# Altium footprint library Miscellaneous THD.PcbLib: 216 footprints (part 9 of 15)
Each footprint in its own frame and in the unit in brackets; x right, y up, seen from the top. Pads: shape width x height; smd on the part's side, far side on the other; paste and mask are expansions set on the pad; w line width, h text height; cw(c..) or ccw(c..) is an arc to the next point about the centre after c.
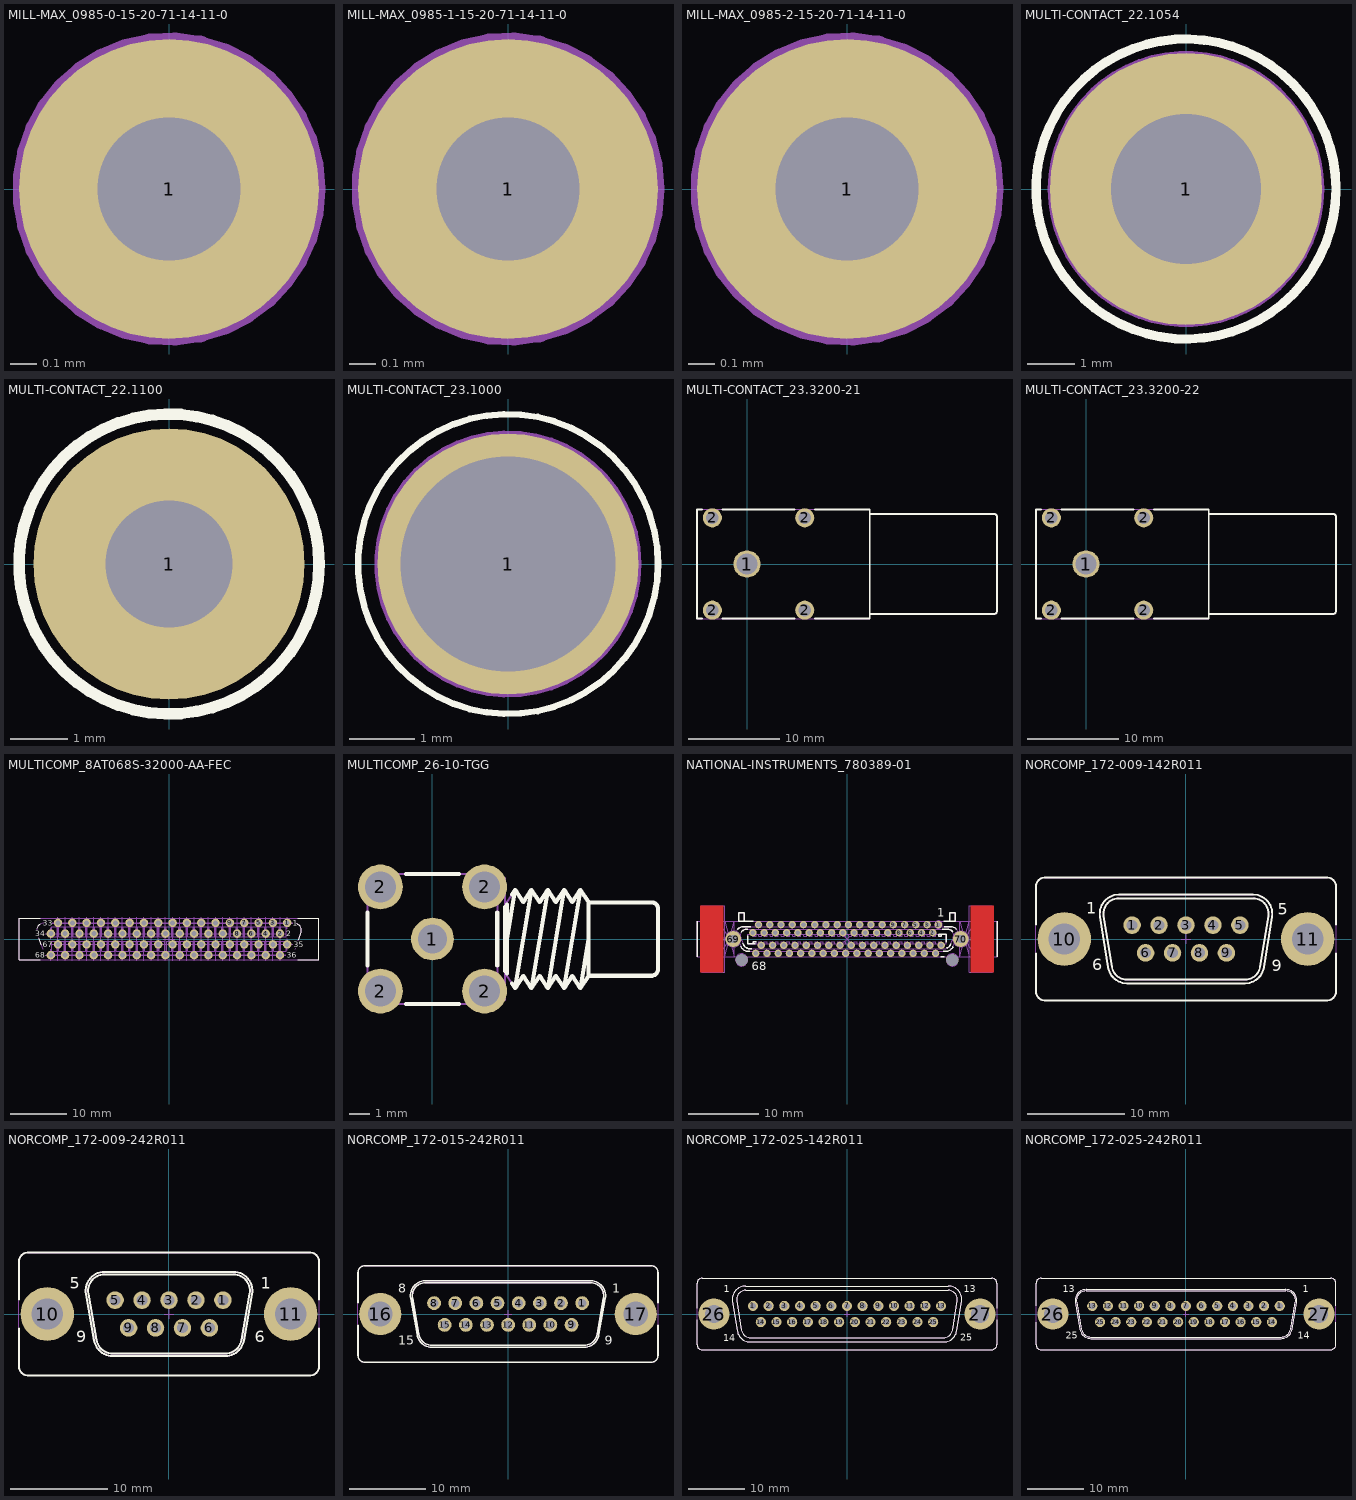
[diagram p8: the footprints below, top view; thin cyan lines are the x and y axes]

## MILL-MAX_0985-0-15-20-71-14-11-0 [mm] "Probe, Spring-Loaded Pin, 2A Continuous, 3A Peak, -55..125°C (Soldered Pin 2.61mm)"
height 6.3
pads (1):
  round 1.15 hole 0.55: 1(0,0)
Mechanical 8:
  lines w0.05: -0.5,0 0,0 ; 0,-0.5 0,0 ; 0,0.5 0,0 ; 0.5,0 0,0
Mechanical 14:
  circle w0.1: c0,0 r0.24
  circle w0.1: c0,0 r0.55
3D body "MILL-MAX_0985-0-15-20-71-14-11-0.stp": height 6.27, standoff -2.62, extent -0.542,-0.545 0.546,0.545

## MILL-MAX_0985-1-15-20-71-14-11-0 [mm] "Probe, Spring-Loaded Pin, 2A Continuous, 3A Peak, -55..125°C (Soldered Pin 3.81mm)"
height 6.3
pads (1):
  round 1.15 hole 0.55: 1(0,0)
Mechanical 8:
  lines w0.05: -0.5,0 0,0 ; 0,-0.5 0,0 ; 0,0.5 0,0 ; 0.5,0 0,0
Mechanical 14:
  circle w0.1: c0,0 r0.24
  circle w0.1: c0,0 r0.55
3D body "MILL-MAX_0985-1-15-20-71-14-11-0.stp": height 6.27, standoff -3.81, extent -0.542,-0.545 0.546,0.545

## MILL-MAX_0985-2-15-20-71-14-11-0 [mm] "Probe, Spring-Loaded Pin, 2A Continuous, 3A Peak, -55..125°C (Soldered Pin 4.83mm)"
height 6.3
pads (1):
  round 1.15 hole 0.55: 1(0,0)
Mechanical 8:
  lines w0.05: -0.5,0 0,0 ; 0,-0.5 0,0 ; 0,0.5 0,0 ; 0.5,0 0,0
Mechanical 14:
  circle w0.1: c0,0 r0.24
  circle w0.1: c0,0 r0.55
3D body "MILL-MAX_0985-2-15-20-71-14-11-0.stp": height 6.27, standoff -4.83, extent -0.542,-0.545 0.546,0.545

## MULTI-CONTACT_22.1054 [mm]
pads (1):
  round 5.8 hole 3.2: 1(0,0)
Top Overlay:
  circle w0.2: c0,0 r3.2
Mechanical 8:
  circle w0.1: c0,0 r1.75
  circle w0.1: c0,0 r2.9
  lines w0.1: -0.5,0 0,0 ; 0,-0.5 0,0 ; 0,0.5 0,0 ; 0.5,0 0,0
Mechanical 14:
  circle w0.1: c0,0 r2.5
  circle w0.1: c0,0 r1.8
  circle w0.1: c0,0 r2
  circle w0.1: c0,0 r1.949
3D body "MULTI-CONTACT_22.1054.stp": height 16, standoff 0, extent -2.5,-2.5 2.5,2.5

## MULTI-CONTACT_22.1100 [mm] "25A Multilam 2mm x 11mm plug, M2 x 10mm Termination"
height 13
pads (1):
  round 4.7 hole 2.2: 1(0,0)
Top Overlay:
  circle w0.2: c0,0 r2.6
Mechanical 8:
  lines w0.1: -1,0 0,0 ; 0,-1 0,0 ; 0,1 0,0 ; 1,0 0,0
Mechanical 14:
  circle w0.1: c0,0 r1.949
  circle w0.1: c0,0 r1
  lines w0.1: -1.949,-1.125 0,-2.25 1.949,-1.125 1.949,1.125 0,2.25 -1.949,1.125 -1.949,-1.125
3D body "MULTI-CONTACT_22.1100.stp": height 13, standoff -10, extent -1.948,-2.25 1.949,2.25

## MULTI-CONTACT_23.1000 [mm] "Uninsulated Ø 2 mm Rigid Socket"
height 2
pads (1):
  round 4 hole 3.3: 1(0,0)
Top Overlay:
  circle w0.1: c0,0 r2.3
Mechanical 8:
  circle w0.1: c0,0 r1.85
  lines w0.1: -0.5,0 0,0 ; 0,-0.5 0,0 ; 0,0.5 0,0 ; 0.5,0 0,0
Mechanical 14:
  circle w0.1: c0,0 r2
  circle w0.1: c0,0 r1
3D body "MULTI-CONTACT_23.1000.stp": height 2, standoff -4, extent -2,-2 2,2

## MULTI-CONTACT_23.3200-21 [mm] "MULTI-CONTACT Black Insulated Ø 4mm Angled Socket SLB4-I/90 For Banana 4mm"
height 11.5
pads (5):
  round 3 hole 2.3: 1(0,0)
  round 2.1 hole 1.4: 2(-3.81,-5.08) 2(-3.81,5.08) 2(6.35,-5.08) 2(6.35,5.08)
Top Overlay:
  lines w0.2: -4.931,-6 -5.5,-6 -5.5,6 -4.931,6 ; -2.689,-6 5.229,-6 ; -2.689,6 5.229,6 ; 7.471,-6 13.5,-6 13.5,6 7.471,6 ; 13.5,-5.5 27.2,-5.5 ccw(c27.2,-5.2) 27.5,-5.2 27.5,5.2 ccw(c27.2,5.2) 27.2,5.5 13.5,5.5
Mechanical 8:
  lines w0.1: -4.81,-5.08 -3.81,-5.08 ; -4.81,5.08 -3.81,5.08 ; -3.81,-6.08 -3.81,-5.08 ; -3.81,-4.08 -3.81,-5.08 ; -3.81,4.08 -3.81,5.08 ; -3.81,6.08 -3.81,5.08 ; -2.81,-5.08 -3.81,-5.08 ; -2.81,5.08 -3.81,5.08 ; -1,0 0,0 ; 0,-1 0,0 ; 0,1 0,0 ; 1,0 0,0 ; 5.35,-5.08 6.35,-5.08 ; 5.35,5.08 6.35,5.08 ; 6.35,-6.08 6.35,-5.08 ; 6.35,-4.08 6.35,-5.08 ; 6.35,4.08 6.35,5.08 ; 6.35,6.08 6.35,5.08 ; 7.35,-5.08 6.35,-5.08 ; 7.35,5.08 6.35,5.08
Mechanical 14:
  lines w0.1: 13.5,-5.5 27.2,-5.5 ccw(c27.2,-5.2) 27.5,-5.2 27.5,5.2 ccw(c27.2,5.2) 27.2,5.5 13.5,5.5 ; -5.5,-6 -5.5,6 13.5,6 13.5,-6 -5.5,-6
3D body "MULTI-CONTACT_23.3200-21.stp": height 12.3, standoff -3.4, extent -5.5,-6 27.5,6

## MULTI-CONTACT_23.3200-22 [mm] "Multi-Contact Red Insulated Ø 4mm Angled Socket SLB4-I/90 For Banana 4mm"
height 11.5
pads (5):
  round 3 hole 2.3: 1(0,0)
  round 2.1 hole 1.4: 2(-3.81,-5.08) 2(-3.81,5.08) 2(6.35,-5.08) 2(6.35,5.08)
Top Overlay:
  lines w0.2: -4.931,-6 -5.5,-6 -5.5,6 -4.931,6 ; -2.689,-6 5.229,-6 ; -2.689,6 5.229,6 ; 7.471,-6 13.5,-6 13.5,6 7.471,6 ; 13.5,-5.5 27.2,-5.5 ccw(c27.2,-5.2) 27.5,-5.2 27.5,5.2 ccw(c27.2,5.2) 27.2,5.5 13.5,5.5
Mechanical 8:
  lines w0.1: -4.81,-5.08 -3.81,-5.08 ; -4.81,5.08 -3.81,5.08 ; -3.81,-6.08 -3.81,-5.08 ; -3.81,-4.08 -3.81,-5.08 ; -3.81,4.08 -3.81,5.08 ; -3.81,6.08 -3.81,5.08 ; -2.81,-5.08 -3.81,-5.08 ; -2.81,5.08 -3.81,5.08 ; -1,0 0,0 ; 0,-1 0,0 ; 0,1 0,0 ; 1,0 0,0 ; 5.35,-5.08 6.35,-5.08 ; 5.35,5.08 6.35,5.08 ; 6.35,-6.08 6.35,-5.08 ; 6.35,-4.08 6.35,-5.08 ; 6.35,4.08 6.35,5.08 ; 6.35,6.08 6.35,5.08 ; 7.35,-5.08 6.35,-5.08 ; 7.35,5.08 6.35,5.08
Mechanical 14:
  lines w0.1: 13.5,-5.5 27.2,-5.5 ccw(c27.2,-5.2) 27.5,-5.2 27.5,5.2 ccw(c27.2,5.2) 27.2,5.5 13.5,5.5 ; -5.5,-6 -5.5,6 13.5,6 13.5,-6 -5.5,-6
3D body "MULTI-CONTACT_23.3200-22.stp": height 12.3, standoff -3.4, extent -5.5,-6 27.5,6

## MULTICOMP_8AT068S-32000-AA-FEC [mm] "68 Way,  Pitch .050\", D-Type SCSI2, Through-hole Vertical Socket"
height 8.4
pads (68):
  round 1.5 hole 0.9: 1(20.955,2.858) 2(19.685,0.953) 3(18.415,2.858) 4(17.145,0.953) 5(15.875,2.858) 6(14.605,0.953) 7(13.335,2.858) 8(12.065,0.953) 9(10.795,2.858) 10(9.525,0.953) 11(8.255,2.858) 12(6.985,0.953) 13(5.715,2.858) 14(4.445,0.953) 15(3.175,2.858) 16(1.905,0.953) 17(0.635,2.858) 18(-0.635,0.953) 19(-1.905,2.858) 20(-3.175,0.953) 21(-4.445,2.858) 22(-5.715,0.953) 23(-6.985,2.858) 24(-8.255,0.953) 25(-9.525,2.858) 26(-10.795,0.953) 27(-12.065,2.858) 28(-13.335,0.953) 29(-14.605,2.858) 30(-15.875,0.953) 31(-17.145,2.858) 32(-18.415,0.953) 33(-19.685,2.858) 34(-20.955,0.953) 35(20.955,-0.952) 36(19.685,-2.857) 37(18.415,-0.952) 38(17.145,-2.857) 39(15.875,-0.952) 40(14.605,-2.857) 41(13.335,-0.952) 42(12.065,-2.857) 43(10.795,-0.952) 44(9.525,-2.857) 45(8.255,-0.952) 46(6.985,-2.857) 47(5.715,-0.952) 48(4.445,-2.857) 49(3.175,-0.952) 50(1.905,-2.857) 51(0.635,-0.952) 52(-0.635,-2.857) 53(-1.905,-0.952) 54(-3.175,-2.857) 55(-4.445,-0.952) 56(-5.715,-2.857) 57(-6.985,-0.952) 58(-8.255,-2.857) 59(-9.525,-0.952) 60(-10.795,-2.857) 61(-12.065,-0.952) 62(-13.335,-2.857) 63(-14.605,-0.952) 64(-15.875,-2.857) 65(-17.145,-0.952) 66(-18.415,-2.857) 67(-19.685,-0.952) 68(-20.955,-2.857)
Top Overlay:
  lines w0.2: -23.443,1.89 cw(c-22.234,1.5) -22.873,2.597 ; -23.083,0.089 -22.709,-1.012 ; -22.8,-3.65 -26.6,-3.65 -26.6,3.65 -22.8,3.65 ; 22.614,2.709 cw(c22.225,1.5) 23.452,1.171 23.017,-0.106 ; 22.8,-3.65 26.6,-3.65 26.6,3.65 22.8,3.65
  text "68" at -23.705,-3.358 h1
  text "67" at -22.385,-1.478 h1
  text "33" at -22.386,2.358 h1
  text "34" at -23.685,0.453 h1
  text "36" at 20.865,-3.358 h1
  text "35" at 22.139,-1.453 h1
  text "2" at 20.793,0.453 h1
  text "1" at 21.975,2.358 h1
Mechanical 8:
  drawing of 798 lines, arcs and shapes, not listed
Mechanical 14:
  drawing of 275 lines, arcs and shapes, not listed
  text "68" at -23.705,-3.358 h1
  text "67" at -22.385,-1.478 h1
  text "33" at -22.386,2.358 h1
  text "34" at -23.685,0.453 h1
  text "36" at 20.865,-3.358 h1
  text "35" at 22.139,-1.453 h1
  text "2" at 20.793,0.453 h1
  text "1" at 21.975,2.358 h1
3D body "MULTICOMP_8AT068S-32000-AA-FEC.stp": height 8.4, standoff -3.6, extent -26.6,-3.65 26.6,3.65

## MULTICOMP_26-10-TGG [mm] "50 Ohm Right Angle PCB Mount SMC Jack Receptacle"
height 7.1
pads (5):
  round 2.1 hole 1.4: 1(0,0)
  round 2.2 hole 1.5: 2(-2.55,-2.55) 2(-2.55,2.55) 2(2.55,-2.55) 2(2.55,2.55)
Top Overlay:
  lines w0.2: -3.175,-1.297 -3.175,1.297 ; -1.297,-3.175 1.297,-3.175 ; -1.297,3.175 1.297,3.175 ; 3.175,-1.297 3.175,1.297 ; 3.55,-1.57 3.55,1.57 ; 3.65,-1.684 3.65,1.684 ; 3.65,0 4.05,2.41 ; 3.903,-2.189 4.05,-2.41 ; 3.903,2.189 4.05,2.41 ; 7.65,-1.8 10.75,-1.8 ; 7.65,0 7.25,-2.41 ; 7.65,1.79 10.75,1.79 cw(c10.75,1.49) 11.05,1.49 ; 10.75,-1.79 ccw(c10.75,-1.49) 11.05,-1.49 ; 11.05,-1.5 11.05,1.5 ; 4.05,-2.41 4.45,-1.81 4.85,-2.41 ; 4.05,-2.41 4.85,2.41 ; 4.05,2.41 4.45,1.81 4.85,2.41 ; 4.85,-2.41 5.25,-1.81 5.65,-2.41 ; 4.85,-2.41 5.65,2.41 ; 4.85,2.41 5.25,1.81 5.65,2.41 ; 5.65,-2.41 6.05,-1.81 6.45,-2.41 ; 5.65,-2.41 6.45,2.41 ; 5.65,2.41 6.05,1.81 6.45,2.41 ; 6.45,-2.41 6.85,-1.81 7.25,-2.41 ; 6.45,-2.41 7.25,2.41 ; 6.45,2.41 6.85,1.81 7.25,2.41 ; 7.25,-2.41 7.65,-1.81 ; 7.25,2.41 7.65,1.81 ; 7.65,-1.81 7.65,1.81 ; 7.65,-1.81 7.65,1.81
Mechanical 8:
  lines w0.1: -3.05,-2.55 -2.55,-2.55 ; -3.05,2.55 -2.55,2.55 ; -2.55,-3.05 -2.55,-2.55 ; -2.55,-2.05 -2.55,-2.55 ; -2.55,2.05 -2.55,2.55 ; -2.55,3.05 -2.55,2.55 ; -2.05,-2.55 -2.55,-2.55 ; -2.05,2.55 -2.55,2.55 ; -0.5,0 0,0 ; 0,-0.5 0,0 ; 0,0.5 0,0 ; 0.5,0 0,0 ; 2.05,-2.55 2.55,-2.55 ; 2.05,2.55 2.55,2.55 ; 2.55,-3.05 2.55,-2.55 ; 2.55,-2.05 2.55,-2.55 ; 2.55,2.05 2.55,2.55 ; 2.55,3.05 2.55,2.55 ; 3.05,-2.55 2.55,-2.55 ; 3.05,2.55 2.55,2.55
Mechanical 14:
  lines w0.1: 3.175,-3 3.55,-3 3.55,3 3.175,3 ; 3.55,-1.81 3.65,-1.81 ; 3.55,1.81 3.65,1.81 ; 3.65,0 4.05,2.41 ; 7.65,-1.8 10.75,-1.8 ; 7.65,0 7.25,-2.41 ; 7.65,1.79 10.75,1.79 cw(c10.75,1.49) 11.05,1.49 ; 10.75,-1.79 ccw(c10.75,-1.49) 11.05,-1.49 ; 11.05,-1.5 11.05,1.5 ; 3.65,-1.81 4.05,-2.41 ; 3.65,-1.81 3.65,1.81 ; 3.65,1.81 4.05,2.41 ; 4.05,-2.41 4.45,-1.81 4.85,-2.41 ; 4.05,-2.41 4.85,2.41 ; 4.05,2.41 4.45,1.81 4.85,2.41 ; 4.85,-2.41 5.25,-1.81 5.65,-2.41 ; 4.85,-2.41 5.65,2.41 ; 4.85,2.41 5.25,1.81 5.65,2.41 ; 5.65,-2.41 6.05,-1.81 6.45,-2.41 ; 5.65,-2.41 6.45,2.41 ; 5.65,2.41 6.05,1.81 6.45,2.41 ; 6.45,-2.41 6.85,-1.81 7.25,-2.41 ; 6.45,-2.41 7.25,2.41 ; 6.45,2.41 6.85,1.81 7.25,2.41 ; 7.25,-2.41 7.65,-1.81 ; 7.25,2.41 7.65,1.81 ; 7.65,-1.81 7.65,1.81 ; 7.65,-1.81 7.65,1.81 ; -3.175,-3.175 3.175,-3.175 3.175,3.175 -3.175,3.175 -3.175,-3.175
3D body "MULTICOMP_26-10-TGG.stp": height 7.1, standoff -3.9, extent -3.175,-3.175 11.05,3.175

## NATIONAL-INSTRUMENTS_780389-01 [mm] "68 Positions, Pitch 0.8mm, Very Hight Density Vertical VHDCI Receptacle"
height 10.75
pads (72):
  round 1.05 hole 0.65: 1(13.005,2.05) 2(12.205,0.9) 3(11.405,2.05) 4(10.605,0.9) 5(9.805,2.05) 6(9.005,0.9) 7(8.205,2.05) 8(7.405,0.9) 9(6.605,2.05) 10(5.805,0.9) 11(5.005,2.05) 12(4.205,0.9) 13(3.405,2.05) 14(2.605,0.9) 15(1.805,2.05) 16(1.005,0.9) 17(0.205,2.05) 18(-0.595,0.9) 19(-1.395,2.05) 20(-2.195,0.9) 21(-2.995,2.05) 22(-3.795,0.9) 23(-4.595,2.05) 24(-5.395,0.9) 25(-6.195,2.05) 26(-6.995,0.9) 27(-7.795,2.05) 28(-8.595,0.9) 29(-9.395,2.05) 30(-10.195,0.9) 31(-10.995,2.05) 32(-11.795,0.9) 33(-12.595,2.05) 34(-13.395,0.9) 35(13.405,-0.9) 36(12.605,-2.05) 37(11.805,-0.9) 38(11.005,-2.05) 39(10.205,-0.9) 40(9.405,-2.05) 41(8.605,-0.9) 42(7.805,-2.05) 43(7.005,-0.9) 44(6.205,-2.05) 45(5.405,-0.9) 46(4.605,-2.05) 47(3.805,-0.9) 48(3.005,-2.05) 49(2.205,-0.9) 50(1.405,-2.05) 51(0.605,-0.9) 52(-0.195,-2.05) 53(-0.995,-0.9) 54(-1.795,-2.05) 55(-2.595,-0.9) 56(-3.395,-2.05) 57(-4.195,-0.9) 58(-4.995,-2.05) 59(-5.795,-0.9) 60(-6.595,-2.05) 61(-7.395,-0.9) 62(-8.195,-2.05) 63(-8.995,-0.9) 64(-9.795,-2.05) 65(-10.595,-0.9) 66(-11.395,-2.05) 67(-12.195,-0.9) 68(-12.995,-2.05)
  round 2.25 hole 1.2: 69(-16.175,0) 70(16.175,0)
  round 0.5 hole 1.75 unplated mask+0.625: 71(-15,-2.98) 72(15,-2.98)
Top Layer:
  region: 17.635,4.7 20.885,4.7 20.885,-4.7 17.635,-4.7
  region: -20.885,4.7 -20.885,-4.7 -17.635,-4.7 -17.635,4.7
Top Overlay:
  lines w0.2: -21.35,-2.5 -21.35,2.5 ; -15.602,1.359 cw(c-14.825,0.73) -14.825,1.73 -13.672,1.73 ; -15.111,-1.022 -15.05,-1.153 ccw(c-14.144,-0.73) -14.144,-1.73 -13.809,-1.73 ; -15.073,0.98 cw(c-14.325,0.48) -14.325,1.38 -14.127,1.38 ; -14.821,-0.586 -14.693,-0.86 ccw(c-13.877,-0.48) -13.877,-1.38 -13.558,-1.38 ; -14.6,2.5 -14.6,3.75 -15.4,3.75 -15.4,2.5 -13.345,2.5 ; -14.15,0.458 -14.15,-0.675 -13.041,-0.675 ; -13.35,-0.675 -13.35,-0.407 -12.95,-0.407 ; 13.355,-2.5 13.873,-2.5 ; 13.45,0.675 13.45,0.42 13.05,0.42 13.05,0.675 14.15,0.675 14.15,-0.441 ; 13.568,1.38 14.325,1.38 cw(c14.325,0.48) 15.043,1.022 ; 13.682,-1.73 14.144,-1.73 ccw(c14.144,-0.73) 15.05,-1.153 15.089,-1.07 ; 13.755,2.5 15.4,2.5 15.4,3.75 14.6,3.75 14.6,2.5 ; 13.819,1.73 14.825,1.73 cw(c14.825,0.73) 15.568,1.399 ; 14.166,-1.333 ccw(c13.877,-0.48) 14.693,-0.86 14.793,-0.645 ; 21.35,-2.5 21.35,2.5
  text "1" at 12.835,3.175 h1.2
  text "68" at -13.537,-4.436 h1.2
Mechanical 8:
  drawing of 330 lines, arcs and shapes, not listed
Mechanical 14:
  drawing of 264 lines, arcs and shapes, not listed
  text "33" at -13.502,3.216 h1.2
  text "1" at 12.835,3.175 h1.2
  text "68" at -13.537,-4.436 h1.2
  text "36" at 11.428,-4.496 h1.2
3D body "NATIONAL-INSTRUMENTS_780389-01.stp": height 10.7, standoff -3.1, extent -21.35,-3.75 21.35,3.75

## NORCOMP_172-009-142R011 [mm] "Straight Wire Wrap D-Sub 9 Contacts Male Connector"
height 12.24
pads (11):
  round 1.8 hole 1.1: 1(-5.537,1.422) 2(-2.769,1.422) 3(0,1.422) 4(2.769,1.422) 5(5.537,1.422) 6(-4.153,-1.422) 7(-1.384,-1.422) 8(1.384,-1.422) 9(4.153,-1.422)
  round 5.5 hole 3.2: 10(-12.497,0) 11(12.497,0)
Top Overlay:
  lines w0.2: -15.405,-1.5 -15.405,-5.41 ccw(c-14.516,-5.41) -14.516,-6.299 14.516,-6.299 ccw(c14.516,-5.41) 15.405,-5.41 15.405,-1.5 ; -15.405,1.5 -15.405,5.41 cw(c-14.516,5.41) -14.516,6.299 14.516,6.299 cw(c14.516,5.41) 15.405,5.41 15.405,1.5 ; -8.834,2.293 cw(c-6.903,2.604) -6.903,4.559 6.903,4.559 cw(c6.903,2.604) 8.834,2.293 7.996,-2.914 cw(c6.065,-2.604) 6.065,-4.559 -6.065,-4.559 cw(c-6.065,-2.604) -7.996,-2.914 -8.834,2.293 ; -8.458,2.353 cw(c-6.903,2.604) -6.903,4.178 6.903,4.178 cw(c6.903,2.604) 8.458,2.353 7.62,-2.854 cw(c6.065,-2.604) 6.065,-4.178 -6.065,-4.178 cw(c-6.065,-2.604) -7.62,-2.854 -8.458,2.353
  text "5" at 9.4,2.5 h1.2
  text "1" at -10.234,2.6 h1.2
  text "9" at 8.8,-3.3 h1.2
  text "6" at -9.634,-3.2 h1.2
Mechanical 8:
  lines w0.1: -12.997,0 -12.497,0 ; -12.497,-0.5 -12.497,0 ; -12.497,0.5 -12.497,0 ; -11.997,0 -12.497,0 ; -6.037,1.422 -5.537,1.422 ; -5.537,0.922 -5.537,1.422 ; -5.537,1.922 -5.537,1.422 ; -5.037,1.422 -5.537,1.422 ; -4.653,-1.422 -4.153,-1.422 ; -4.153,-1.922 -4.153,-1.422 ; -4.153,-0.922 -4.153,-1.422 ; -3.653,-1.422 -4.153,-1.422 ; -3.269,1.422 -2.769,1.422 ; -2.769,0.922 -2.769,1.422 ; -2.769,1.922 -2.769,1.422 ; -2.269,1.422 -2.769,1.422 ; -1.884,-1.422 -1.384,-1.422 ; -1.384,-1.922 -1.384,-1.422 ; -1.384,-0.922 -1.384,-1.422 ; -0.884,-1.422 -1.384,-1.422 ; -0.5,0 0,0 ; -0.5,1.422 0,1.422 ; 0,-0.5 0,0 ; 0,0.5 0,0 ; 0,0.922 0,1.422 ; 0,1.922 0,1.422 ; 0.5,0 0,0 ; 0.5,1.422 0,1.422 ; 0.884,-1.422 1.384,-1.422 ; 1.384,-1.922 1.384,-1.422 ; 1.384,-0.922 1.384,-1.422 ; 1.884,-1.422 1.384,-1.422 ; 2.269,1.422 2.769,1.422 ; 2.769,0.922 2.769,1.422 ; 2.769,1.922 2.769,1.422 ; 3.269,1.422 2.769,1.422 ; 3.653,-1.422 4.153,-1.422 ; 4.153,-1.922 4.153,-1.422 ; 4.153,-0.922 4.153,-1.422 ; 4.653,-1.422 4.153,-1.422 ; 5.037,1.422 5.537,1.422 ; 5.537,0.922 5.537,1.422 ; 5.537,1.922 5.537,1.422 ; 6.037,1.422 5.537,1.422 ; 11.997,0 12.497,0 ; 12.497,-0.5 12.497,0 ; 12.497,0.5 12.497,0 ; 12.997,0 12.497,0
Mechanical 14:
  circle w0.1: c12.497,0 r1.524
  circle w0.1: c-12.497,0 r2
  circle w0.1: c12.497,0 r2
  circle w0.1: c-12.497,0 r1.524
  circle w0.1: c-4.153,-1.422 r0.305
  circle w0.1: c-1.384,-1.422 r0.305
  circle w0.1: c1.384,-1.422 r0.305
  circle w0.1: c4.153,-1.422 r0.305
  circle w0.1: c5.537,1.422 r0.305
  circle w0.1: c2.769,1.422 r0.305
  circle w0.1: c0,1.422 r0.305
  circle w0.1: c-2.769,1.422 r0.305
  circle w0.1: c-5.537,1.422 r0.305
  lines w0.1: 14.516,-6.299 ccw(c14.516,-5.41) 15.405,-5.41 ; 14.516,-6.299 ccw(c14.516,-5.41) 15.405,-5.41 ; 14.516,-6.299 -14.516,-6.299 cw(c-14.516,-5.41) -15.405,-5.41 -15.405,5.41 cw(c-14.516,5.41) -14.516,6.299 14.516,6.299 cw(c14.516,5.41) 15.405,5.41 15.405,-5.41 ; -8.834,2.293 cw(c-6.903,2.603) -6.903,4.559 6.903,4.559 cw(c6.903,2.603) 8.834,2.293 7.996,-2.914 cw(c6.065,-2.604) 6.065,-4.559 -6.065,-4.559 cw(c-6.065,-2.604) -7.996,-2.914 -8.834,2.293 ; -8.458,2.353 cw(c-6.903,2.603) -6.903,4.178 6.903,4.178 cw(c6.903,2.603) 8.458,2.353 7.62,-2.854 cw(c6.065,-2.604) 6.065,-4.178 -6.065,-4.178 cw(c-6.065,-2.604) -7.62,-2.854 -8.458,2.353
  text "6" at -9.634,-3.2 h1.2
  text "9" at 8.8,-3.3 h1.2
  text "1" at -10.234,2.6 h1.2
  text "5" at 9.4,2.5 h1.2
3D body "NORCOMP_172-009-142R011.stp": height 11.77, standoff -12.7, extent -15.405,-6.299 15.405,6.299

## NORCOMP_172-009-242R011 [mm] "Straight Wire Wrap D-Sub 9 Contacts Female Connector"
height 12.08
pads (11):
  round 1.8 hole 1.1: 1(5.537,1.422) 2(2.769,1.422) 3(0,1.422) 4(-2.769,1.422) 5(-5.537,1.422) 6(4.153,-1.422) 7(1.384,-1.422) 8(-1.384,-1.422) 9(-4.153,-1.422)
  round 5.5 hole 3.2: 10(-12.497,0) 11(12.497,0)
Top Overlay:
  lines w0.2: -15.405,-1.5 -15.405,-5.41 ccw(c-14.516,-5.41) -14.516,-6.299 14.516,-6.299 ccw(c14.516,-5.41) 15.405,-5.41 15.405,-1.5 ; -15.405,1.5 -15.405,5.41 cw(c-14.516,5.41) -14.516,6.299 14.516,6.299 cw(c14.516,5.41) 15.405,5.41 15.405,1.5 ; -8.529,2.035 cw(c-6.603,2.375) -6.603,4.331 6.603,4.331 cw(c6.603,2.375) 8.529,2.035 7.69,-2.715 cw(c5.764,-2.375) 5.764,-4.331 -5.764,-4.331 cw(c-5.764,-2.375) -7.69,-2.715 -8.529,2.035 ; -8.278,2.079 cw(c-6.603,2.375) -6.603,4.077 6.603,4.077 cw(c6.603,2.375) 8.279,2.079 7.44,-2.671 cw(c5.764,-2.375) 5.764,-4.077 -5.764,-4.077 cw(c-5.764,-2.375) -7.44,-2.671 -8.278,2.079
  text "9" at -9.5,-2.9 h1.2
  text "6" at 8.8,-2.9 h1.2
  text "5" at -10.175,2.6 h1.2
  text "1" at 9.4,2.6 h1.2
Mechanical 8:
  lines w0.1: -12.997,0 -12.497,0 ; -12.497,-0.5 -12.497,0 ; -12.497,0.5 -12.497,0 ; -11.997,0 -12.497,0 ; -6.037,1.422 -5.537,1.422 ; -5.537,0.922 -5.537,1.422 ; -5.537,1.922 -5.537,1.422 ; -5.037,1.422 -5.537,1.422 ; -4.653,-1.422 -4.153,-1.422 ; -4.153,-1.922 -4.153,-1.422 ; -4.153,-0.922 -4.153,-1.422 ; -3.653,-1.422 -4.153,-1.422 ; -3.269,1.422 -2.769,1.422 ; -2.769,0.922 -2.769,1.422 ; -2.769,1.922 -2.769,1.422 ; -2.269,1.422 -2.769,1.422 ; -1.884,-1.422 -1.384,-1.422 ; -1.384,-1.922 -1.384,-1.422 ; -1.384,-0.922 -1.384,-1.422 ; -0.884,-1.422 -1.384,-1.422 ; -0.5,0 0,0 ; -0.5,1.422 0,1.422 ; 0,-0.5 0,0 ; 0,0.5 0,0 ; 0,0.922 0,1.422 ; 0,1.922 0,1.422 ; 0.5,0 0,0 ; 0.5,1.422 0,1.422 ; 0.884,-1.422 1.384,-1.422 ; 1.384,-1.922 1.384,-1.422 ; 1.384,-0.922 1.384,-1.422 ; 1.884,-1.422 1.384,-1.422 ; 2.269,1.422 2.769,1.422 ; 2.769,0.922 2.769,1.422 ; 2.769,1.922 2.769,1.422 ; 3.269,1.422 2.769,1.422 ; 3.653,-1.422 4.153,-1.422 ; 4.153,-1.922 4.153,-1.422 ; 4.153,-0.922 4.153,-1.422 ; 4.653,-1.422 4.153,-1.422 ; 5.037,1.422 5.537,1.422 ; 5.537,0.922 5.537,1.422 ; 5.537,1.922 5.537,1.422 ; 6.037,1.422 5.537,1.422 ; 11.997,0 12.497,0 ; 12.497,-0.5 12.497,0 ; 12.497,0.5 12.497,0 ; 12.997,0 12.497,0
Mechanical 14:
  circle w0.1: c12.497,0 r2
  circle w0.1: c-12.497,0 r2
  circle w0.1: c-12.497,0 r2
  circle w0.1: c12.497,0 r1.524
  circle w0.1: c-12.497,0 r1.524
  circle w0.1: c-4.153,-1.422 r0.61
  circle w0.1: c-1.384,-1.422 r0.61
  circle w0.1: c1.384,-1.422 r0.61
  circle w0.1: c4.153,-1.422 r0.61
  circle w0.1: c5.537,1.422 r0.61
  circle w0.1: c2.769,1.422 r0.61
  circle w0.1: c0,1.422 r0.61
  circle w0.1: c-2.769,1.422 r0.61
  circle w0.1: c-5.537,1.422 r0.61
  lines w0.1: -15.405,-5.41 ccw(c-14.516,-5.41) -14.516,-6.299 14.516,-6.299 ccw(c14.516,-5.41) 15.405,-5.41 15.405,5.41 ccw(c14.516,5.41) 14.516,6.299 -14.516,6.299 ccw(c-14.516,5.41) -15.405,5.41 -15.405,-5.41 ; -8.529,2.035 cw(c-6.603,2.375) -6.603,4.331 6.603,4.331 cw(c6.603,2.375) 8.529,2.035 7.69,-2.715 cw(c5.764,-2.375) 5.764,-4.331 -5.764,-4.331 cw(c-5.764,-2.375) -7.69,-2.715 -8.529,2.035 ; -8.278,2.079 cw(c-6.603,2.375) -6.603,4.077 6.603,4.077 cw(c6.603,2.375) 8.279,2.079 7.44,-2.671 cw(c5.764,-2.375) 5.764,-4.077 -5.764,-4.077 cw(c-5.764,-2.375) -7.44,-2.671 -8.278,2.079
  text "1" at 9.4,2.6 h1.2
  text "5" at -10.175,2.6 h1.2
  text "6" at 8.8,-2.9 h1.2
  text "9" at -9.5,-2.9 h1.2
3D body "NORCOMP_172-009-242R011.stp": height 11.82, standoff -12.7, extent -15.405,-6.299 15.405,6.299

## NORCOMP_172-015-242R011 [mm] "Straight Wire Wrap D-Sub 15 Contacts Female Connector"
height 12.08
pads (17):
  round 1.8 hole 1.1: 1(9.661,1.422) 2(6.901,1.422) 3(4.14,1.422) 4(1.38,1.422) 5(-1.38,1.422) 6(-4.14,1.422) 7(-6.901,1.422) 8(-9.661,1.422) 9(8.277,-1.422) 10(5.516,-1.422) 11(2.756,-1.422) 12(-0.004,-1.422) 13(-2.764,-1.422) 14(-5.525,-1.422) 15(-8.285,-1.422)
  round 5.5 hole 3.2: 16(-16.679,0) 17(16.646,0)
Top Overlay:
  lines w0.2: -19.587,-1.5 -19.587,-5.41 ccw(c-18.698,-5.41) -18.698,-6.299 18.665,-6.299 ccw(c18.665,-5.41) 19.554,-5.41 19.554,-1.5 ; -19.587,1.5 -19.587,5.41 cw(c-18.698,5.41) -18.698,6.299 18.665,6.299 cw(c18.665,5.41) 19.554,5.41 19.554,1.5 ; -12.724,2.035 cw(c-10.797,2.375) -10.797,4.331 10.764,4.331 cw(c10.764,2.375) 12.69,2.035 11.852,-2.715 cw(c9.926,-2.375) 9.926,-4.331 -9.959,-4.331 cw(c-9.959,-2.375) -11.885,-2.715 -12.724,2.035 ; -12.477,2.078 cw(c-10.797,2.375) -10.797,4.081 10.764,4.081 cw(c10.764,2.375) 12.444,2.078 11.606,-2.671 cw(c9.926,-2.375) 9.926,-4.081 -9.959,-4.081 cw(c-9.959,-2.375) -11.639,-2.671 -12.477,2.078
  text "15" at -14.325,-4 h1.2
  text "8" at -14.35,2.75 h1.2
  text "1" at 13.61,2.75 h1.2
  text "9" at 12.6,-4 h1.2
Mechanical 8:
  lines w0.1: -17.179,0 -16.679,0 ; -16.679,-0.5 -16.679,0 ; -16.679,0.5 -16.679,0 ; -16.179,0 -16.679,0 ; -10.161,1.422 -9.661,1.422 ; -9.661,0.922 -9.661,1.422 ; -9.661,1.922 -9.661,1.422 ; -9.161,1.422 -9.661,1.422 ; -8.785,-1.422 -8.285,-1.422 ; -8.285,-1.922 -8.285,-1.422 ; -8.285,-0.922 -8.285,-1.422 ; -7.785,-1.422 -8.285,-1.422 ; -7.401,1.422 -6.901,1.422 ; -6.901,0.922 -6.901,1.422 ; -6.901,1.922 -6.901,1.422 ; -6.401,1.422 -6.901,1.422 ; -6.025,-1.422 -5.525,-1.422 ; -5.525,-1.922 -5.525,-1.422 ; -5.525,-0.922 -5.525,-1.422 ; -5.025,-1.422 -5.525,-1.422 ; -4.64,1.422 -4.14,1.422 ; -4.14,0.922 -4.14,1.422 ; -4.14,1.922 -4.14,1.422 ; -3.64,1.422 -4.14,1.422 ; -3.264,-1.422 -2.764,-1.422 ; -2.764,-1.922 -2.764,-1.422 ; -2.764,-0.922 -2.764,-1.422 ; -2.264,-1.422 -2.764,-1.422 ; -1.88,1.422 -1.38,1.422 ; -1.38,0.922 -1.38,1.422 ; -1.38,1.922 -1.38,1.422 ; -0.88,1.422 -1.38,1.422 ; -0.504,-1.422 -0.004,-1.422 ; -0.5,0 0,0 ; -0.004,-1.922 -0.004,-1.422 ; -0.004,-0.922 -0.004,-1.422 ; 0,-0.5 0,0 ; 0,0.5 0,0 ; 0.496,-1.422 -0.004,-1.422 ; 0.5,0 0,0 ; 0.88,1.422 1.38,1.422 ; 1.38,0.922 1.38,1.422 ; 1.38,1.922 1.38,1.422 ; 1.88,1.422 1.38,1.422 ; 2.256,-1.422 2.756,-1.422 ; 2.756,-1.922 2.756,-1.422 ; 2.756,-0.922 2.756,-1.422 ; 3.256,-1.422 2.756,-1.422 ; 3.64,1.422 4.14,1.422 ; 4.14,0.922 4.14,1.422 ; 4.14,1.922 4.14,1.422 ; 4.64,1.422 4.14,1.422 ; 5.016,-1.422 5.516,-1.422 ; 5.516,-1.922 5.516,-1.422 ; 5.516,-0.922 5.516,-1.422 ; 6.016,-1.422 5.516,-1.422 ; 6.401,1.422 6.901,1.422 ; 6.901,0.922 6.901,1.422 ; 6.901,1.922 6.901,1.422 ; 7.401,1.422 6.901,1.422 ; 7.777,-1.422 8.277,-1.422 ; 8.277,-1.922 8.277,-1.422 ; 8.277,-0.922 8.277,-1.422 ; 8.777,-1.422 8.277,-1.422 ; 9.161,1.422 9.661,1.422 ; 9.661,0.922 9.661,1.422 ; 9.661,1.922 9.661,1.422 ; 10.161,1.422 9.661,1.422 ; 16.146,0 16.646,0 ; 16.646,-0.5 16.646,0 ; 16.646,0.5 16.646,0 ; 17.146,0 16.646,0
Mechanical 14:
  circle w0.1: c-9.661,1.422 r0.61
  circle w0.1: c-6.901,1.422 r0.61
  circle w0.1: c-4.14,1.422 r0.61
  circle w0.1: c-1.38,1.422 r0.61
  circle w0.1: c1.38,1.422 r0.61
  circle w0.1: c4.14,1.422 r0.61
  circle w0.1: c6.901,1.422 r0.61
  circle w0.1: c9.661,1.422 r0.61
  circle w0.1: c8.277,-1.422 r0.61
  circle w0.1: c5.516,-1.422 r0.61
  circle w0.1: c2.756,-1.422 r0.61
  circle w0.1: c-0.004,-1.422 r0.61
  circle w0.1: c-2.764,-1.422 r0.61
  circle w0.1: c-5.525,-1.422 r0.61
  circle w0.1: c-8.285,-1.422 r0.61
  circle w0.1: c-16.679,0 r1.524
  circle w0.1: c-16.679,0 r2
  circle w0.1: c16.646,0 r1.524
  circle w0.1: c16.646,0 r2
  lines w0.1: -19.587,-5.41 ccw(c-18.698,-5.41) -18.698,-6.299 18.665,-6.299 ccw(c18.665,-5.41) 19.554,-5.41 19.554,5.41 ccw(c18.665,5.41) 18.665,6.299 -18.698,6.299 ccw(c-18.698,5.41) -19.587,5.41 -19.587,-5.41 ; -12.724,2.035 cw(c-10.797,2.375) -10.797,4.331 10.764,4.331 cw(c10.764,2.375) 12.69,2.035 11.852,-2.715 cw(c9.926,-2.375) 9.926,-4.331 -9.959,-4.331 cw(c-9.959,-2.375) -11.885,-2.715 -12.724,2.035 ; -12.477,2.078 cw(c-10.797,2.375) -10.797,4.081 10.764,4.081 cw(c10.764,2.375) 12.444,2.078 11.606,-2.671 cw(c9.926,-2.375) 9.926,-4.081 -9.959,-4.081 cw(c-9.959,-2.375) -11.639,-2.671 -12.477,2.078
  text "9" at 12.6,-4 h1.2
  text "1" at 13.61,2.75 h1.2
  text "8" at -14.35,2.75 h1.2
  text "15" at -14.325,-4 h1.2
3D body "NORCOMP_172-015-242R011.stp": height 11.82, standoff -12.7, extent -19.587,-6.299 19.554,6.299

## NORCOMP_172-025-142R011 [mm] "Straight Wire Wrap D-Sub 25 Contacts Male Connector"
height 12.24
pads (27):
  round 1.8 hole 1.1: 1(-16.612,1.422) 2(-13.843,1.422) 3(-11.074,1.422) 4(-8.306,1.422) 5(-5.537,1.422) 6(-2.769,1.422) 7(0,1.422) 8(2.769,1.422) 9(5.537,1.422) 10(8.306,1.422) 11(11.074,1.422) 12(13.843,1.422) 13(16.612,1.422) 14(-15.227,-1.422) 15(-12.459,-1.422) 16(-9.69,-1.422) 17(-6.922,-1.422) 18(-4.153,-1.422) 19(-1.384,-1.422) 20(1.384,-1.422) 21(4.153,-1.422) 22(6.922,-1.422) 23(9.69,-1.422) 24(12.459,-1.422) 25(15.227,-1.422)
  round 5.5 hole 3.2: 26(-23.52,0) 27(23.521,0)
Top Overlay:
  lines w0.2: -26.505,-1.006 -26.505,-5.41 ccw(c-25.616,-5.41) -25.616,-6.299 25.615,-6.299 ccw(c25.615,-5.41) 26.504,-5.41 26.504,-1.009 ; -26.505,1.006 -26.505,5.41 cw(c-25.616,5.41) -25.616,6.299 25.615,6.299 cw(c25.615,5.41) 26.504,5.41 26.504,1.009 ; -20.235,2.232 cw(c-17.928,2.604) -17.928,4.94 17.927,4.94 cw(c17.927,2.604) 20.234,2.232 19.395,-2.975 cw(c17.088,-2.604) 17.088,-4.94 -17.089,-4.94 cw(c-17.089,-2.604) -19.396,-2.975 -20.235,2.232 ; -19.482,2.353 cw(c-17.928,2.604) -17.928,4.178 17.927,4.178 cw(c17.927,2.604) 19.481,2.353 18.643,-2.854 cw(c17.088,-2.604) 17.088,-4.178 -17.089,-4.178 cw(c-17.089,-2.604) -18.644,-2.854 -19.482,2.353
  text "13" at 20.6,3.8 h1.2
  text "14" at -21.875,-4.8 h1.2
  text "1" at -21.75,3.8 h1.2
  text "25" at 20.05,-4.725 h1.2
Mechanical 8:
  drawing of 164 lines, arcs and shapes, not listed
Mechanical 14:
  circle w0.1: c-16.612,1.422 r0.305
  circle w0.1: c23.52,0 r2
  circle w0.1: c23.52,0 r1.524
  circle w0.1: c-23.52,0 r2
  circle w0.1: c-23.52,0 r1.524
  circle w0.1: c-13.843,1.422 r0.305
  circle w0.1: c-15.227,-1.422 r0.305
  circle w0.1: c-12.459,-1.422 r0.305
  circle w0.1: c-11.074,1.422 r0.305
  circle w0.1: c-8.306,1.422 r0.305
  circle w0.1: c-9.69,-1.422 r0.305
  circle w0.1: c-6.922,-1.422 r0.305
  circle w0.1: c-5.537,1.422 r0.305
  circle w0.1: c-2.769,1.422 r0.305
  circle w0.1: c-4.153,-1.422 r0.305
  circle w0.1: c-1.384,-1.422 r0.305
  circle w0.1: c0,1.422 r0.305
  circle w0.1: c2.769,1.422 r0.305
  circle w0.1: c1.384,-1.422 r0.305
  circle w0.1: c4.153,-1.422 r0.305
  circle w0.1: c5.537,1.422 r0.305
  circle w0.1: c8.306,1.422 r0.305
  circle w0.1: c6.922,-1.422 r0.305
  circle w0.1: c9.69,-1.422 r0.305
  circle w0.1: c11.074,1.422 r0.305
  circle w0.1: c12.459,-1.422 r0.305
  circle w0.1: c13.843,1.422 r0.305
  circle w0.1: c15.227,-1.422 r0.305
  circle w0.1: c16.612,1.422 r0.305
  lines w0.1: -26.505,-5.41 ccw(c-25.616,-5.41) -25.616,-6.299 25.615,-6.299 ccw(c25.615,-5.41) 26.504,-5.41 26.504,5.41 ccw(c25.615,5.41) 25.615,6.299 -25.616,6.299 ccw(c-25.616,5.41) -26.505,5.41 -26.505,-5.41 ; -20.235,2.232 cw(c-17.928,2.604) -17.928,4.94 17.927,4.94 cw(c17.927,2.604) 20.234,2.232 19.395,-2.975 cw(c17.088,-2.604) 17.088,-4.94 -17.089,-4.94 cw(c-17.089,-2.604) -19.396,-2.975 -20.235,2.232 ; -19.482,2.353 cw(c-17.928,2.604) -17.928,4.178 17.927,4.178 cw(c17.927,2.604) 19.481,2.353 18.643,-2.854 cw(c17.088,-2.604) 17.088,-4.178 -17.089,-4.178 cw(c-17.089,-2.604) -18.644,-2.854 -19.482,2.353
  text "25" at 20.05,-4.725 h1.2
  text "1" at -21.75,3.8 h1.2
  text "14" at -21.875,-4.8 h1.2
  text "13" at 20.6,3.8 h1.2
3D body "NORCOMP_172-025-142R011.stp": height 11.77, standoff -12.78, extent -26.505,-6.299 26.505,6.299

## NORCOMP_172-025-242R011 [mm] "Straight Wire Wrap D-Sub 25 Contacts Female Connector"
height 12.08
pads (27):
  round 1.8 hole 1.1: 1(16.561,1.422) 2(13.801,1.422) 3(11.041,1.422) 4(8.281,1.422) 5(5.52,1.422) 6(2.76,1.422) 7(0,1.422) 8(-2.76,1.422) 9(-5.52,1.422) 10(-8.281,1.422) 11(-11.041,1.422) 12(-13.801,1.422) 13(-16.561,1.422) 14(15.177,-1.422) 15(12.417,-1.422) 16(9.657,-1.422) 17(6.896,-1.422) 18(4.136,-1.422) 19(1.376,-1.422) 20(-1.384,-1.422) 21(-4.145,-1.422) 22(-6.905,-1.422) 23(-9.665,-1.422) 24(-12.425,-1.422) 25(-15.185,-1.422)
  round 5.5 hole 3.2: 26(-23.52,0) 27(23.521,0)
Top Overlay:
  lines w0.2: -26.504,-1.5 -26.504,-5.41 ccw(c-25.615,-5.41) -25.615,-6.299 25.616,-6.299 ccw(c25.616,-5.41) 26.505,-5.41 26.505,-1.5 ; -26.504,1.5 -26.504,5.41 cw(c-25.615,5.41) -25.615,6.299 25.616,6.299 cw(c25.616,5.41) 26.505,5.41 26.505,1.5 ; -19.577,2.035 cw(c-17.651,2.375) -17.651,4.331 17.652,4.331 cw(c17.652,2.375) 19.578,2.035 18.74,-2.715 cw(c16.814,-2.375) 16.814,-4.331 -16.813,-4.331 cw(c-16.813,-2.375) -18.739,-2.715 -19.577,2.035 ; -19.327,2.079 cw(c-17.651,2.375) -17.651,4.077 17.652,4.077 cw(c17.652,2.375) 19.328,2.079 18.49,-2.671 cw(c16.814,-2.375) 16.814,-4.077 -16.813,-4.077 cw(c-16.813,-2.375) -18.489,-2.671 -19.327,2.079
  text "1" at 20.6,3.8 h1.2
  text "25" at -21.25,-4.4 h1.2
  text "13" at -21.75,3.8 h1.2
  text "14" at 19.75,-4.4 h1.2
Mechanical 8:
  lines w0.1: -24.02,0 -23.52,0 ; -23.52,-0.5 -23.52,0 ; -23.52,0.5 -23.52,0 ; -23.02,0 -23.52,0 ; -17.061,1.422 -16.561,1.422 ; -16.561,0.922 -16.561,1.422 ; -16.561,1.922 -16.561,1.422 ; -16.061,1.422 -16.561,1.422 ; -15.685,-1.422 -15.185,-1.422 ; -15.185,-1.922 -15.185,-1.422 ; -15.185,-0.922 -15.185,-1.422 ; -14.685,-1.422 -15.185,-1.422 ; -14.301,1.422 -13.801,1.422 ; -13.801,0.922 -13.801,1.422 ; -13.801,1.922 -13.801,1.422 ; -13.301,1.422 -13.801,1.422 ; -12.925,-1.422 -12.425,-1.422 ; -12.425,-1.922 -12.425,-1.422 ; -12.425,-0.922 -12.425,-1.422 ; -11.925,-1.422 -12.425,-1.422 ; -11.541,1.422 -11.041,1.422 ; -11.041,0.922 -11.041,1.422 ; -11.041,1.922 -11.041,1.422 ; -10.541,1.422 -11.041,1.422 ; -10.165,-1.422 -9.665,-1.422 ; -9.665,-1.922 -9.665,-1.422 ; -9.665,-0.922 -9.665,-1.422 ; -9.165,-1.422 -9.665,-1.422 ; -8.781,1.422 -8.281,1.422 ; -8.281,0.922 -8.281,1.422 ; -8.281,1.922 -8.281,1.422 ; -7.781,1.422 -8.281,1.422 ; -7.405,-1.422 -6.905,-1.422 ; -6.905,-1.922 -6.905,-1.422 ; -6.905,-0.922 -6.905,-1.422 ; -6.405,-1.422 -6.905,-1.422 ; -6.02,1.422 -5.52,1.422 ; -5.52,0.922 -5.52,1.422 ; -5.52,1.922 -5.52,1.422 ; -5.02,1.422 -5.52,1.422 ; -4.645,-1.422 -4.145,-1.422 ; -4.145,-1.922 -4.145,-1.422 ; -4.145,-0.922 -4.145,-1.422 ; -3.645,-1.422 -4.145,-1.422 ; -3.26,1.422 -2.76,1.422 ; -2.76,0.922 -2.76,1.422 ; -2.76,1.922 -2.76,1.422 ; -2.26,1.422 -2.76,1.422 ; -1.884,-1.422 -1.384,-1.422 ; -1.384,-1.922 -1.384,-1.422 ; -1.384,-0.922 -1.384,-1.422 ; -0.884,-1.422 -1.384,-1.422 ; -0.5,0 0,0 ; -0.5,1.422 0,1.422 ; 0,-0.5 0,0 ; 0,0.5 0,0 ; 0,0.922 0,1.422 ; 0,1.922 0,1.422 ; 0.5,0 0,0 ; 0.5,1.422 0,1.422 ; 0.876,-1.422 1.376,-1.422 ; 1.376,-1.922 1.376,-1.422 ; 1.376,-0.922 1.376,-1.422 ; 1.876,-1.422 1.376,-1.422 ; 2.26,1.422 2.76,1.422 ; 2.76,0.922 2.76,1.422 ; 2.76,1.922 2.76,1.422 ; 3.26,1.422 2.76,1.422 ; 3.636,-1.422 4.136,-1.422 ; 4.136,-1.922 4.136,-1.422 ; 4.136,-0.922 4.136,-1.422 ; 4.636,-1.422 4.136,-1.422 ; 5.02,1.422 5.52,1.422 ; 5.52,0.922 5.52,1.422 ; 5.52,1.922 5.52,1.422 ; 6.02,1.422 5.52,1.422 ; 6.396,-1.422 6.896,-1.422 ; 6.896,-1.922 6.896,-1.422 ; 6.896,-0.922 6.896,-1.422 ; 7.396,-1.422 6.896,-1.422 ; 7.781,1.422 8.281,1.422 ; 8.281,0.922 8.281,1.422 ; 8.281,1.922 8.281,1.422 ; 8.781,1.422 8.281,1.422 ; 9.157,-1.422 9.657,-1.422 ; 9.657,-1.922 9.657,-1.422 ; 9.657,-0.922 9.657,-1.422 ; 10.157,-1.422 9.657,-1.422 ; 10.541,1.422 11.041,1.422 ; 11.041,0.922 11.041,1.422 ; 11.041,1.922 11.041,1.422 ; 11.541,1.422 11.041,1.422 ; 11.917,-1.422 12.417,-1.422 ; 12.417,-1.922 12.417,-1.422 ; 12.417,-0.922 12.417,-1.422 ; 12.917,-1.422 12.417,-1.422 ; 13.301,1.422 13.801,1.422 ; 13.801,0.922 13.801,1.422 ; 13.801,1.922 13.801,1.422 ; 14.301,1.422 13.801,1.422 ; 14.677,-1.422 15.177,-1.422 ; 15.177,-1.922 15.177,-1.422 ; 15.177,-0.922 15.177,-1.422 ; 15.677,-1.422 15.177,-1.422 ; 16.061,1.422 16.561,1.422 ; 16.561,0.922 16.561,1.422 ; 16.561,1.922 16.561,1.422 ; 17.061,1.422 16.561,1.422 ; 23.021,0 23.521,0 ; 23.521,-0.5 23.521,0 ; 23.521,0.5 23.521,0 ; 24.021,0 23.521,0
Mechanical 14:
  circle w0.1: c-16.561,1.422 r0.61
  circle w0.1: c-15.185,-1.422 r0.61
  circle w0.1: c-13.801,1.422 r0.61
  circle w0.1: c-12.425,-1.422 r0.61
  circle w0.1: c-11.041,1.422 r0.61
  circle w0.1: c-9.665,-1.422 r0.61
  circle w0.1: c-8.281,1.422 r0.61
  circle w0.1: c-6.905,-1.422 r0.61
  circle w0.1: c-5.52,1.422 r0.61
  circle w0.1: c-4.145,-1.422 r0.61
  circle w0.1: c-2.76,1.422 r0.61
  circle w0.1: c-1.384,-1.422 r0.61
  circle w0.1: c1.376,-1.422 r0.61
  circle w0.1: c0,1.422 r0.61
  circle w0.1: c2.76,1.422 r0.61
  circle w0.1: c4.136,-1.422 r0.61
  circle w0.1: c5.52,1.422 r0.61
  circle w0.1: c6.896,-1.422 r0.61
  circle w0.1: c8.281,1.422 r0.61
  circle w0.1: c9.657,-1.422 r0.61
  circle w0.1: c12.417,-1.422 r0.61
  circle w0.1: c11.041,1.422 r0.61
  circle w0.1: c13.801,1.422 r0.61
  circle w0.1: c15.177,-1.422 r0.61
  circle w0.1: c16.561,1.422 r0.61
  circle w0.1: c-23.52,0 r1.524
  circle w0.1: c-23.52,0 r2
  circle w0.1: c23.521,0 r1.524
  circle w0.1: c23.521,0 r2
  lines w0.1: -26.504,-5.41 ccw(c-25.615,-5.41) -25.615,-6.299 25.616,-6.299 ccw(c25.616,-5.41) 26.505,-5.41 26.505,5.41 ccw(c25.616,5.41) 25.616,6.299 -25.615,6.299 ccw(c-25.615,5.41) -26.504,5.41 -26.504,-5.41 ; -19.577,2.035 cw(c-17.651,2.375) -17.651,4.331 17.652,4.331 cw(c17.652,2.375) 19.578,2.035 18.74,-2.715 cw(c16.814,-2.375) 16.814,-4.331 -16.813,-4.331 cw(c-16.813,-2.375) -18.739,-2.715 -19.577,2.035 ; -19.327,2.079 cw(c-17.651,2.375) -17.651,4.077 17.652,4.077 cw(c17.652,2.375) 19.328,2.079 18.49,-2.671 cw(c16.814,-2.375) 16.814,-4.077 -16.813,-4.077 cw(c-16.813,-2.375) -18.489,-2.671 -19.327,2.079
  text "14" at 19.75,-4.4 h1.2
  text "13" at -21.75,3.8 h1.2
  text "25" at -21.25,-4.4 h1.2
  text "1" at 20.6,3.8 h1.2
3D body "NORCOMP_172-025-242R011.stp": height 11.9, standoff -12.7, extent -26.504,-6.299 26.505,6.299